# Altium footprint library COOP4403_FULL.PcbLib: 52 footprints (part 1 of 4)
Each footprint in its own frame and in the unit in brackets; x right, y up, seen from the top. Pads: shape width x height; smd on the part's side, far side on the other; paste and mask are expansions set on the pad; w line width, h text height; cw(c..) or ccw(c..) is an arc to the next point about the centre after c.
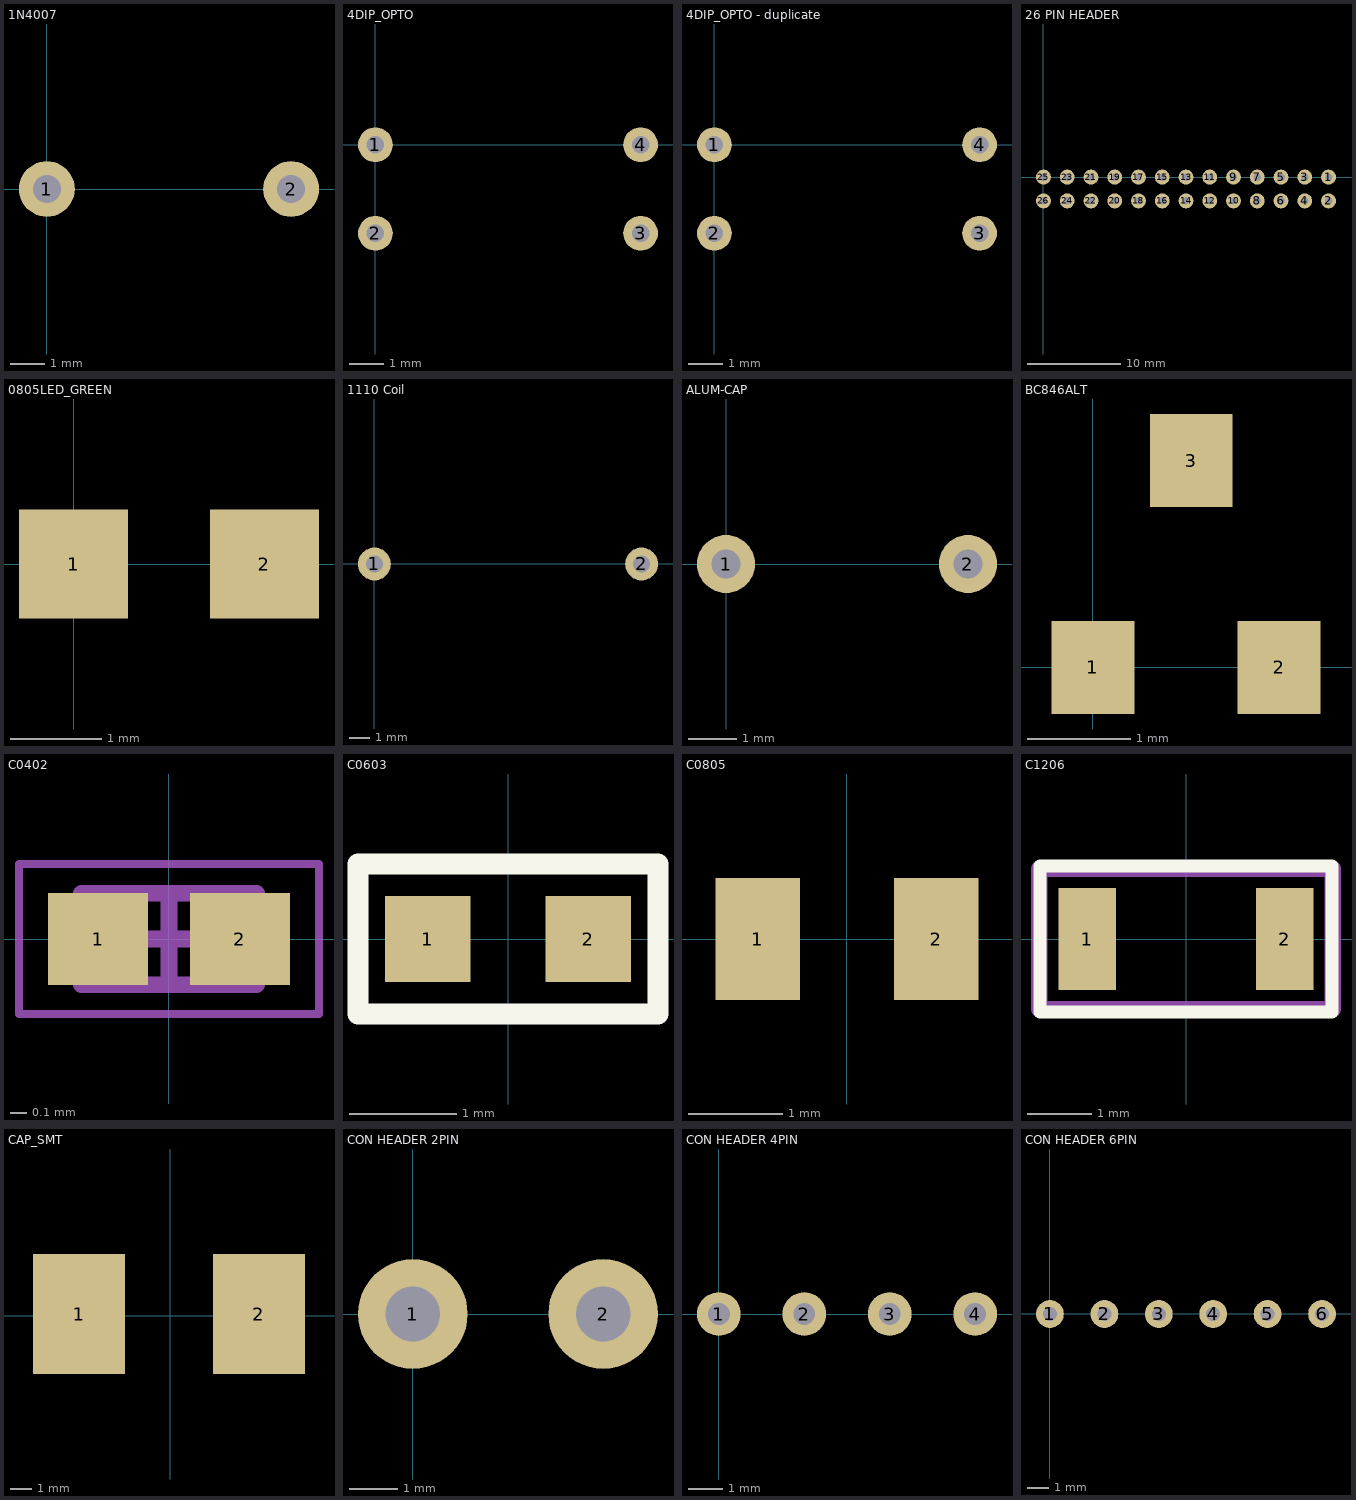
[diagram p0: the footprints below, top view; thin cyan lines are the x and y axes]

## 1N4007 [mm]
pads (2):
  round 1.6 hole 0.8: 1(0,0) 2(7,0)
3D body "User Library-1N4007 x7mm.STEP": height 3.31, standoff -1.9, extent -0.42,-1.31 7.38,1.31

## 4DIP_OPTO [mm]
pads (4):
  round 1 hole 0.5: 1(0,0) 2(0,-2.54) 3(7.62,-2.54) 4(7.62,0)
3D body "User Library-DIP4-7_62-2_54.STEP": height 4.3, standoff -2.7, extent -0.105,-3.565 7.775,1.025

## 4DIP_OPTO - duplicate [mm]
pads (4):
  round 1 hole 0.5: 1(0,0) 2(0,-2.54) 3(7.62,-2.54) 4(7.62,0)
3D body "User Library-DIP4-7_62-2_54.STEP": height 4.3, standoff -2.7, extent -0.105,-3.565 7.775,1.025

## 26 PIN HEADER [mm]
pads (26):
  round 1.6 hole 0.8: 1(30.48,0) 2(30.48,-2.54) 3(27.94,0) 4(27.94,-2.54) 5(25.4,0) 6(25.4,-2.54) 7(22.86,0) 8(22.86,-2.54) 9(20.32,0) 10(20.32,-2.54) 11(17.78,0) 12(17.78,-2.54) 13(15.24,0) 14(15.24,-2.54) 15(12.7,0) 16(12.7,-2.54) 17(10.16,0) 18(10.16,-2.54) 19(7.62,0) 20(7.62,-2.54) 21(5.08,0) 22(5.08,-2.54) 23(2.54,0) 24(2.54,-2.54) 25(0,0) 26(0,-2.54)
3D body "Orange Pi Zero v1_1 - Ensamblaje.STEP": height 16.37, standoff -1.78, extent -11.867,-44.799 39.96,1.245

## 0805LED_GREEN [mm]
pads (2):
  rect 1.2x1.2 smd: 1(0,0) 2(2.1,0)
3D body "alsrobot-LED0805(R).STEP": height 1.1, standoff 0, extent 0.031,-0.6 2.051,0.65

## 1110 Coil [mm]
pads (2):
  round 1.6 hole 0.813: 1(0,0) 2(13,0)
3D body "69661.stp": height 7, standoff 0, extent -0.124,-6.703 12.875,6.297

## ALUM-CAP [mm] "CAP ALUM 100uF 20% 35 Radial"
pads (2):
  round 1.2 hole 0.6: 1(0,0) 2(5,0)
3D body "SW3dPS-Cap electro 10x12.5x5.0mm.STEP": height 13.03, standoff -3.48, extent -2.561,-5.025 7.489,5.026

## BC846ALT [mm]
pads (3):
  rect 0.8x0.9 smd: 1(0,0) 2(1.8,0) 3(0.95,2)
3D body "SW3DPS-SOT-23-DEFAULT.STEP": height 1.05, standoff -0.05, extent -0.56,-0.183 2.44,2.317

## C0402 [mm] "CL05B273K05NNNC 16V X7R"
height 0.65
pads (2):
  rect 0.6x0.55 smd: 1(-0.425,0) 2(0.425,0)
Mechanical 13:
  lines w0.1: -0.525,-0.275 0.525,-0.275 0.525,0.275 -0.525,0.275 -0.525,-0.275
Mechanical 15:
  lines w0.05: -0.9,-0.45 0.9,-0.45 0.9,0.45 -0.9,0.45 -0.9,-0.45
  lines w0.1: -0.275,0 0.275,0 ; 0,-0.275 0,0.275
3D body: height 0.65, standoff 0, extent 0.275,-0.275 0.525,0.275
3D body: height 0.65, standoff 0, extent -0.525,-0.275 -0.275,0.275
3D body: height 0.65, standoff 0, extent -0.275,-0.275 0.275,0.275

## C0603 [mm]
pads (2):
  rect 0.8x0.8 smd: 1(-0.75,0) 2(0.75,0)
Top Overlay:
  lines w0.2: -1.4,-0.7 1.4,-0.7 1.4,0.7 -1.4,0.7 -1.4,-0.7
Mechanical 16:
  lines w0.15: -1.4,-0.7 -1.4,0.7 1.4,0.7 1.4,-0.7 -1.4,-0.7
3D body "C0603.step": height 0.95, standoff 0.15, extent -0.8,-0.425 0.8,0.435
3D body "C0603.step": height 0.79, standoff 0, extent -0.8,-0.425 0.8,0.435

## C0805 [mm]
pads (2):
  rect 0.9x1.3 smd: 1(-0.95,0) 2(0.95,0)
3D body "CAPC2012X95N EIA 0805.step": height 1.5, standoff 0.55, extent -1,-0.6 1,0.6
3D body "CAPC2012X95N EIA 0805.step": height 0.95, standoff 0, extent -1,-0.6 1,0.6

## C1206 [mm]
pads (2):
  rect 0.9x1.6 smd: 1(-1.55,0) 2(1.55,0)
Top Overlay:
  lines w0.2: -2.286,-1.143 2.286,-1.143 2.286,1.143 -2.286,1.143 -2.286,-1.143
Mechanical 16:
  lines w0.254: -2.3,-1.1 -2.3,1.1 2.3,1.1 2.3,-1.1 -2.3,-1.1
3D body "CAPC3216X95N EIA 1206.step": height 1.8, standoff 0.85, extent -1.6,-0.8 1.6,0.8
3D body "CAPC3216X95N EIA 1206.step": height 0.95, standoff 0, extent -1.6,-0.8 1.6,0.8

## CAP_SMT [mm]
pads (2):
  rect 4.3x5.6 smd: 1(-4.242,0.076) 2(4.14,0.076)
3D body "User Library-CL_series_size10x13,5.STEP": height 13.5, standoff 0, extent -5.45,-4.814 5.45,5.486

## CON HEADER 2PIN [mm]
pads (2):
  round 2.28 hole 1.14: 1(0,0) 2(3.96,0)
3D body "User Library-B2P-VH-BK.STEP": height 2.7, standoff -11.9, extent -1.898,-3.869 5.962,4.631

## CON HEADER 4PIN [mm]
pads (4):
  round 1.28 hole 0.64: 1(0,0) 2(2.5,0) 3(5,0) 4(7.5,0)
3D body "SW3dPS-jst-b4b-xh-a-1.STEP": height 7, standoff -3.4, extent -2.39,-2.321 10.01,3.429

## CON HEADER 6PIN [mm]
pads (6):
  round 1.28 hole 0.64: 1(0,0) 2(2.5,0) 3(5,0) 4(7.5,0) 5(10,0) 6(12.5,0)
3D body "SW3dPS-jst-b6b-xh-a.STEP": height 3.2, standoff -7.2, extent -2.414,-3.51 14.986,2.24